# Altium footprint library con-molex.PCBLIB: 368 footprints (part 23 of 26)
Each footprint in its own frame and in the unit in brackets; x right, y up, seen from the top. Pads: shape width x height; smd on the part's side, far side on the other; paste and mask are expansions set on the pad; w line width, h text height; cw(c..) or ccw(c..) is an arc to the next point about the centre after c.
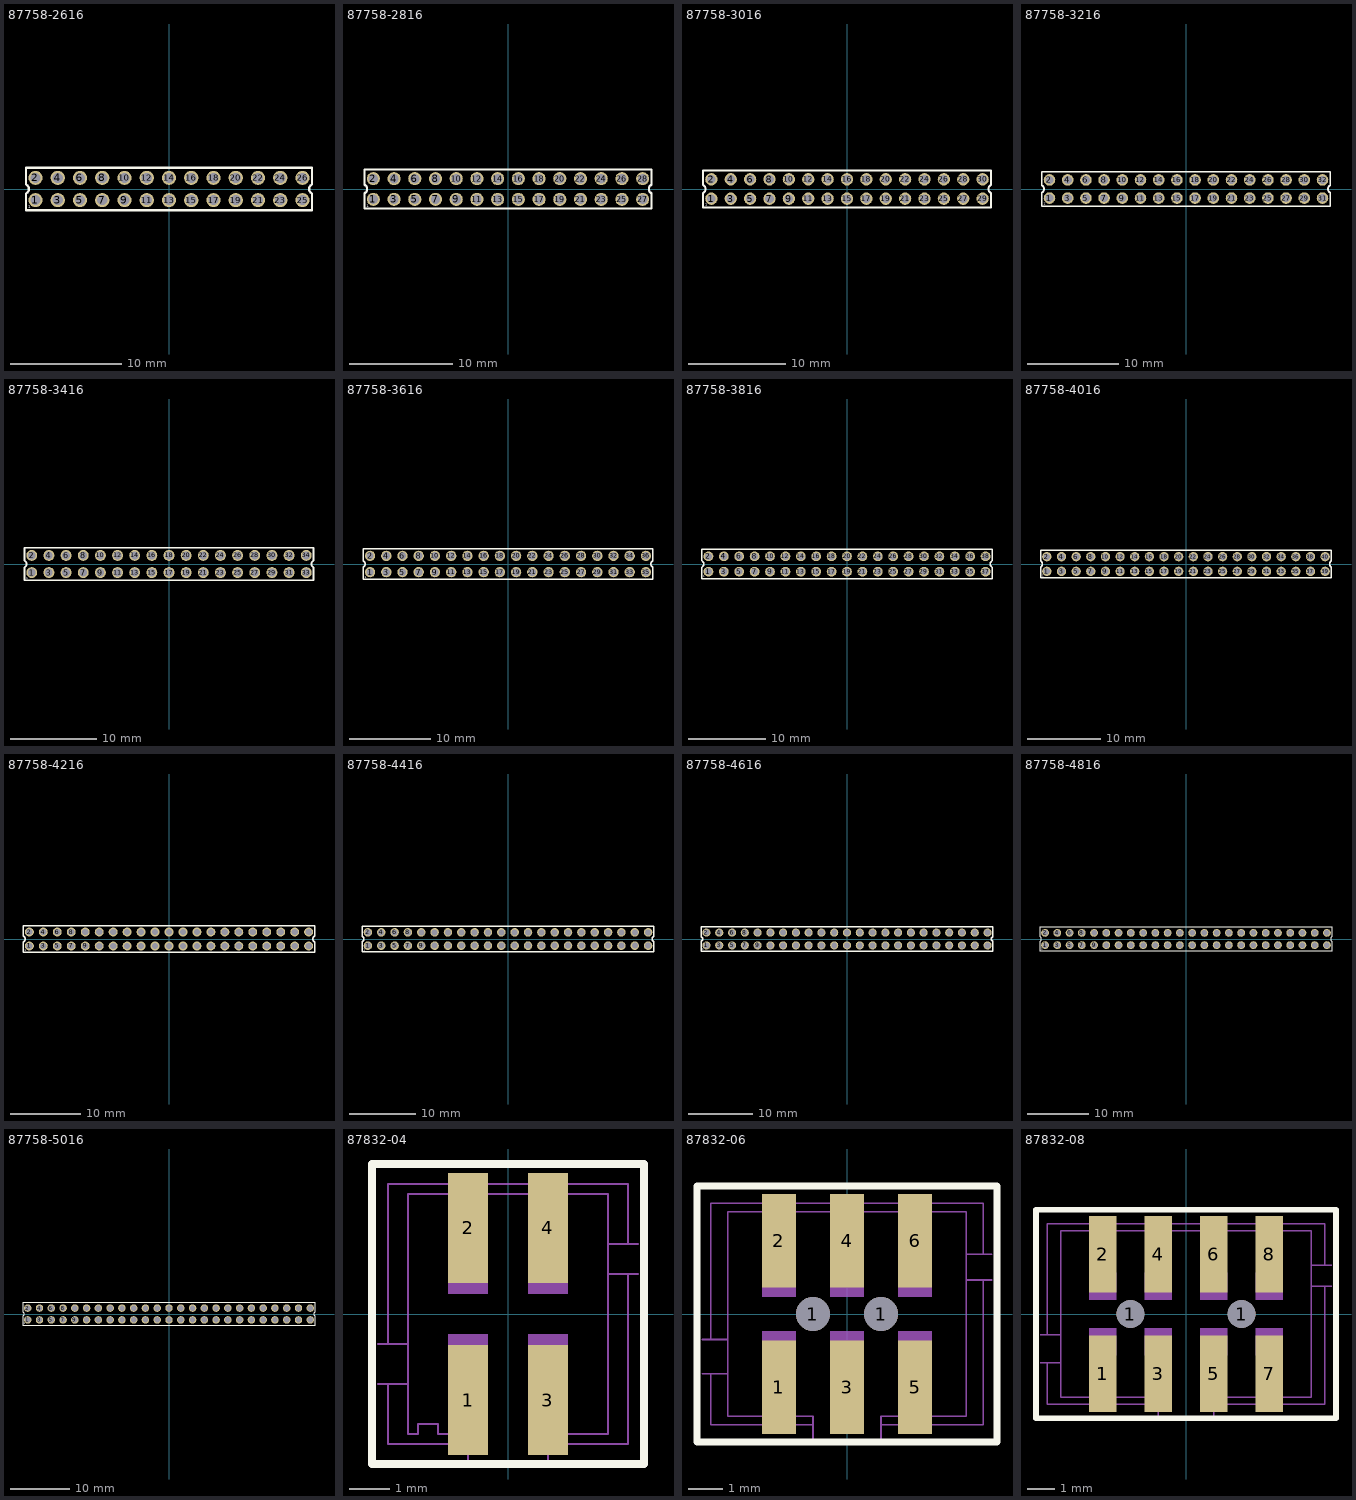
[diagram p22: the footprints below, top view; thin cyan lines are the x and y axes]

## 87758-2616 [mm]
pads (26):
  round 1.27 hole 0.9: 1(-12,-1) 2(-12,1) 3(-10,-1) 4(-10,1) 5(-8,-1) 6(-8,1) 7(-6,-1) 8(-6,1) 9(-4,-1) 10(-4,1) 11(-2,-1) 12(-2,1) 13(0,-1) 14(0,1) 15(2,-1) 16(2,1) 17(4,-1) 18(4,1) 19(6,-1) 20(6,1) 21(8,-1) 22(8,1) 23(10,-1) 24(10,1) 25(12,-1) 26(12,1)
Top Overlay:
  lines w0.203: -12.85,-1.9 12.85,-1.9 12.85,-0.4 cw(c13.04,0) 12.85,0.4 12.85,1.9 -12.85,1.9 -12.85,0.4 cw(c-13.04,0) -12.85,-0.4 -12.85,-1.9
  text "1" at -12.65,-1.75 h0.26
Mechanical 16:
  rectangle: -12.25,-1.25 -11.75,-0.75
  rectangle: -12.25,0.75 -11.75,1.25
  rectangle: -10.25,-1.25 -9.75,-0.75
  rectangle: -10.25,0.75 -9.75,1.25
  rectangle: -8.25,-1.25 -7.75,-0.75
  rectangle: -8.25,0.75 -7.75,1.25
  rectangle: -6.25,-1.25 -5.75,-0.75
  rectangle: -6.25,0.75 -5.75,1.25
  rectangle: -4.25,-1.25 -3.75,-0.75
  rectangle: -4.25,0.75 -3.75,1.25
  rectangle: -2.25,-1.25 -1.75,-0.75
  rectangle: -2.25,0.75 -1.75,1.25
  rectangle: -0.25,-1.25 0.25,-0.75
  rectangle: -0.25,0.75 0.25,1.25
  rectangle: 1.75,-1.25 2.25,-0.75
  rectangle: 1.75,0.75 2.25,1.25
  rectangle: 3.75,-1.25 4.25,-0.75
  rectangle: 3.75,0.75 4.25,1.25
  rectangle: 5.75,-1.25 6.25,-0.75
  rectangle: 5.75,0.75 6.25,1.25
  rectangle: 7.75,-1.25 8.25,-0.75
  rectangle: 7.75,0.75 8.25,1.25
  rectangle: 9.75,-1.25 10.25,-0.75
  rectangle: 9.75,0.75 10.25,1.25
  rectangle: 11.75,-1.25 12.25,-0.75
  rectangle: 11.75,0.75 12.25,1.25

## 87758-2816 [mm]
pads (28):
  round 1.27 hole 0.9: 1(-13,-1) 2(-13,1) 3(-11,-1) 4(-11,1) 5(-9,-1) 6(-9,1) 7(-7,-1) 8(-7,1) 9(-5,-1) 10(-5,1) 11(-3,-1) 12(-3,1) 13(-1,-1) 14(-1,1) 15(1,-1) 16(1,1) 17(3,-1) 18(3,1) 19(5,-1) 20(5,1) 21(7,-1) 22(7,1) 23(9,-1) 24(9,1) 25(11,-1) 26(11,1) 27(13,-1) 28(13,1)
Top Overlay:
  lines w0.203: -13.85,-1.9 13.85,-1.9 13.85,-0.4 cw(c14.04,0) 13.85,0.4 13.85,1.9 -13.85,1.9 -13.85,0.4 cw(c-14.04,0) -13.85,-0.4 -13.85,-1.9
  text "1" at -13.65,-1.75 h0.26
Mechanical 16:
  rectangle: -13.25,-1.25 -12.75,-0.75
  rectangle: -13.25,0.75 -12.75,1.25
  rectangle: -11.25,-1.25 -10.75,-0.75
  rectangle: -11.25,0.75 -10.75,1.25
  rectangle: -9.25,-1.25 -8.75,-0.75
  rectangle: -9.25,0.75 -8.75,1.25
  rectangle: -7.25,-1.25 -6.75,-0.75
  rectangle: -7.25,0.75 -6.75,1.25
  rectangle: -5.25,-1.25 -4.75,-0.75
  rectangle: -5.25,0.75 -4.75,1.25
  rectangle: -3.25,-1.25 -2.75,-0.75
  rectangle: -3.25,0.75 -2.75,1.25
  rectangle: -1.25,-1.25 -0.75,-0.75
  rectangle: -1.25,0.75 -0.75,1.25
  rectangle: 0.75,-1.25 1.25,-0.75
  rectangle: 0.75,0.75 1.25,1.25
  rectangle: 2.75,-1.25 3.25,-0.75
  rectangle: 2.75,0.75 3.25,1.25
  rectangle: 4.75,-1.25 5.25,-0.75
  rectangle: 4.75,0.75 5.25,1.25
  rectangle: 6.75,-1.25 7.25,-0.75
  rectangle: 6.75,0.75 7.25,1.25
  rectangle: 8.75,-1.25 9.25,-0.75
  rectangle: 8.75,0.75 9.25,1.25
  rectangle: 10.75,-1.25 11.25,-0.75
  rectangle: 10.75,0.75 11.25,1.25
  rectangle: 12.75,-1.25 13.25,-0.75
  rectangle: 12.75,0.75 13.25,1.25

## 87758-3016 [mm]
pads (30):
  round 1.27 hole 0.9: 1(-14,-1) 2(-14,1) 3(-12,-1) 4(-12,1) 5(-10,-1) 6(-10,1) 7(-8,-1) 8(-8,1) 9(-6,-1) 10(-6,1) 11(-4,-1) 12(-4,1) 13(-2,-1) 14(-2,1) 15(0,-1) 16(0,1) 17(2,-1) 18(2,1) 19(4,-1) 20(4,1) 21(6,-1) 22(6,1) 23(8,-1) 24(8,1) 25(10,-1) 26(10,1) 27(12,-1) 28(12,1) 29(14,-1) 30(14,1)
Top Overlay:
  lines w0.203: -14.85,-1.9 14.85,-1.9 14.85,-0.4 cw(c15.04,0) 14.85,0.4 14.85,1.9 -14.85,1.9 -14.85,0.4 cw(c-15.04,0) -14.85,-0.4 -14.85,-1.9
  text "1" at -14.65,-1.75 h0.26
Mechanical 16:
  rectangle: -14.25,-1.25 -13.75,-0.75
  rectangle: -14.25,0.75 -13.75,1.25
  rectangle: -12.25,-1.25 -11.75,-0.75
  rectangle: -12.25,0.75 -11.75,1.25
  rectangle: -10.25,-1.25 -9.75,-0.75
  rectangle: -10.25,0.75 -9.75,1.25
  rectangle: -8.25,-1.25 -7.75,-0.75
  rectangle: -8.25,0.75 -7.75,1.25
  rectangle: -6.25,-1.25 -5.75,-0.75
  rectangle: -6.25,0.75 -5.75,1.25
  rectangle: -4.25,-1.25 -3.75,-0.75
  rectangle: -4.25,0.75 -3.75,1.25
  rectangle: -2.25,-1.25 -1.75,-0.75
  rectangle: -2.25,0.75 -1.75,1.25
  rectangle: -0.25,-1.25 0.25,-0.75
  rectangle: -0.25,0.75 0.25,1.25
  rectangle: 1.75,-1.25 2.25,-0.75
  rectangle: 1.75,0.75 2.25,1.25
  rectangle: 3.75,-1.25 4.25,-0.75
  rectangle: 3.75,0.75 4.25,1.25
  rectangle: 5.75,-1.25 6.25,-0.75
  rectangle: 5.75,0.75 6.25,1.25
  rectangle: 7.75,-1.25 8.25,-0.75
  rectangle: 7.75,0.75 8.25,1.25
  rectangle: 9.75,-1.25 10.25,-0.75
  rectangle: 9.75,0.75 10.25,1.25
  rectangle: 11.75,-1.25 12.25,-0.75
  rectangle: 11.75,0.75 12.25,1.25
  rectangle: 13.75,-1.25 14.25,-0.75
  rectangle: 13.75,0.75 14.25,1.25

## 87758-3216 [mm]
pads (32):
  round 1.27 hole 0.9: 1(-15,-1) 2(-15,1) 3(-13,-1) 4(-13,1) 5(-11,-1) 6(-11,1) 7(-9,-1) 8(-9,1) 9(-7,-1) 10(-7,1) 11(-5,-1) 12(-5,1) 13(-3,-1) 14(-3,1) 15(-1,-1) 16(-1,1) 17(1,-1) 18(1,1) 19(3,-1) 20(3,1) 21(5,-1) 22(5,1) 23(7,-1) 24(7,1) 25(9,-1) 26(9,1) 27(11,-1) 28(11,1) 29(13,-1) 30(13,1) 31(15,-1) 32(15,1)
Top Overlay:
  lines w0.203: -15.85,-1.9 15.85,-1.9 15.85,-0.4 cw(c16.04,0) 15.85,0.4 15.85,1.9 -15.85,1.9 -15.85,0.4 cw(c-16.04,0) -15.85,-0.4 -15.85,-1.9
  text "1" at -15.65,-1.75 h0.26
Mechanical 16:
  rectangle: -15.25,-1.25 -14.75,-0.75
  rectangle: -15.25,0.75 -14.75,1.25
  rectangle: -13.25,-1.25 -12.75,-0.75
  rectangle: -13.25,0.75 -12.75,1.25
  rectangle: -11.25,-1.25 -10.75,-0.75
  rectangle: -11.25,0.75 -10.75,1.25
  rectangle: -9.25,-1.25 -8.75,-0.75
  rectangle: -9.25,0.75 -8.75,1.25
  rectangle: -7.25,-1.25 -6.75,-0.75
  rectangle: -7.25,0.75 -6.75,1.25
  rectangle: -5.25,-1.25 -4.75,-0.75
  rectangle: -5.25,0.75 -4.75,1.25
  rectangle: -3.25,-1.25 -2.75,-0.75
  rectangle: -3.25,0.75 -2.75,1.25
  rectangle: -1.25,-1.25 -0.75,-0.75
  rectangle: -1.25,0.75 -0.75,1.25
  rectangle: 0.75,-1.25 1.25,-0.75
  rectangle: 0.75,0.75 1.25,1.25
  rectangle: 2.75,-1.25 3.25,-0.75
  rectangle: 2.75,0.75 3.25,1.25
  rectangle: 4.75,-1.25 5.25,-0.75
  rectangle: 4.75,0.75 5.25,1.25
  rectangle: 6.75,-1.25 7.25,-0.75
  rectangle: 6.75,0.75 7.25,1.25
  rectangle: 8.75,-1.25 9.25,-0.75
  rectangle: 8.75,0.75 9.25,1.25
  rectangle: 10.75,-1.25 11.25,-0.75
  rectangle: 10.75,0.75 11.25,1.25
  rectangle: 12.75,-1.25 13.25,-0.75
  rectangle: 12.75,0.75 13.25,1.25
  rectangle: 14.75,-1.25 15.25,-0.75
  rectangle: 14.75,0.75 15.25,1.25

## 87758-3416 [mm]
pads (34):
  round 1.27 hole 0.9: 1(-16,-1) 2(-16,1) 3(-14,-1) 4(-14,1) 5(-12,-1) 6(-12,1) 7(-10,-1) 8(-10,1) 9(-8,-1) 10(-8,1) 11(-6,-1) 12(-6,1) 13(-4,-1) 14(-4,1) 15(-2,-1) 16(-2,1) 17(0,-1) 18(0,1) 19(2,-1) 20(2,1) 21(4,-1) 22(4,1) 23(6,-1) 24(6,1) 25(8,-1) 26(8,1) 27(10,-1) 28(10,1) 29(12,-1) 30(12,1) 31(14,-1) 32(14,1) 33(16,-1) 34(16,1)
Top Overlay:
  lines w0.203: -16.85,-1.9 16.85,-1.9 16.85,-0.4 cw(c17.04,0) 16.85,0.4 16.85,1.9 -16.85,1.9 -16.85,0.4 cw(c-17.04,0) -16.85,-0.4 -16.85,-1.9
  text "1" at -16.65,-1.75 h0.26
Mechanical 16:
  rectangle: -16.25,-1.25 -15.75,-0.75
  rectangle: -16.25,0.75 -15.75,1.25
  rectangle: -14.25,-1.25 -13.75,-0.75
  rectangle: -14.25,0.75 -13.75,1.25
  rectangle: -12.25,-1.25 -11.75,-0.75
  rectangle: -12.25,0.75 -11.75,1.25
  rectangle: -10.25,-1.25 -9.75,-0.75
  rectangle: -10.25,0.75 -9.75,1.25
  rectangle: -8.25,-1.25 -7.75,-0.75
  rectangle: -8.25,0.75 -7.75,1.25
  rectangle: -6.25,-1.25 -5.75,-0.75
  rectangle: -6.25,0.75 -5.75,1.25
  rectangle: -4.25,-1.25 -3.75,-0.75
  rectangle: -4.25,0.75 -3.75,1.25
  rectangle: -2.25,-1.25 -1.75,-0.75
  rectangle: -2.25,0.75 -1.75,1.25
  rectangle: -0.25,-1.25 0.25,-0.75
  rectangle: -0.25,0.75 0.25,1.25
  rectangle: 1.75,-1.25 2.25,-0.75
  rectangle: 1.75,0.75 2.25,1.25
  rectangle: 3.75,-1.25 4.25,-0.75
  rectangle: 3.75,0.75 4.25,1.25
  rectangle: 5.75,-1.25 6.25,-0.75
  rectangle: 5.75,0.75 6.25,1.25
  rectangle: 7.75,-1.25 8.25,-0.75
  rectangle: 7.75,0.75 8.25,1.25
  rectangle: 9.75,-1.25 10.25,-0.75
  rectangle: 9.75,0.75 10.25,1.25
  rectangle: 11.75,-1.25 12.25,-0.75
  rectangle: 11.75,0.75 12.25,1.25
  rectangle: 13.75,-1.25 14.25,-0.75
  rectangle: 13.75,0.75 14.25,1.25
  rectangle: 15.75,-1.25 16.25,-0.75
  rectangle: 15.75,0.75 16.25,1.25

## 87758-3616 [mm]
pads (36):
  round 1.27 hole 0.9: 1(-17,-1) 2(-17,1) 3(-15,-1) 4(-15,1) 5(-13,-1) 6(-13,1) 7(-11,-1) 8(-11,1) 9(-9,-1) 10(-9,1) 11(-7,-1) 12(-7,1) 13(-5,-1) 14(-5,1) 15(-3,-1) 16(-3,1) 17(-1,-1) 18(-1,1) 19(1,-1) 20(1,1) 21(3,-1) 22(3,1) 23(5,-1) 24(5,1) 25(7,-1) 26(7,1) 27(9,-1) 28(9,1) 29(11,-1) 30(11,1) 31(13,-1) 32(13,1) 33(15,-1) 34(15,1) 35(17,-1) 36(17,1)
Top Overlay:
  lines w0.203: -17.85,-1.9 17.85,-1.9 17.85,-0.4 cw(c18.04,0) 17.85,0.4 17.85,1.9 -17.85,1.9 -17.85,0.4 cw(c-18.04,0) -17.85,-0.4 -17.85,-1.9
  text "1" at -17.65,-1.75 h0.26
Mechanical 16:
  rectangle: -17.25,-1.25 -16.75,-0.75
  rectangle: -17.25,0.75 -16.75,1.25
  rectangle: -15.25,-1.25 -14.75,-0.75
  rectangle: -15.25,0.75 -14.75,1.25
  rectangle: -13.25,-1.25 -12.75,-0.75
  rectangle: -13.25,0.75 -12.75,1.25
  rectangle: -11.25,-1.25 -10.75,-0.75
  rectangle: -11.25,0.75 -10.75,1.25
  rectangle: -9.25,-1.25 -8.75,-0.75
  rectangle: -9.25,0.75 -8.75,1.25
  rectangle: -7.25,-1.25 -6.75,-0.75
  rectangle: -7.25,0.75 -6.75,1.25
  rectangle: -5.25,-1.25 -4.75,-0.75
  rectangle: -5.25,0.75 -4.75,1.25
  rectangle: -3.25,-1.25 -2.75,-0.75
  rectangle: -3.25,0.75 -2.75,1.25
  rectangle: -1.25,-1.25 -0.75,-0.75
  rectangle: -1.25,0.75 -0.75,1.25
  rectangle: 0.75,-1.25 1.25,-0.75
  rectangle: 0.75,0.75 1.25,1.25
  rectangle: 2.75,-1.25 3.25,-0.75
  rectangle: 2.75,0.75 3.25,1.25
  rectangle: 4.75,-1.25 5.25,-0.75
  rectangle: 4.75,0.75 5.25,1.25
  rectangle: 6.75,-1.25 7.25,-0.75
  rectangle: 6.75,0.75 7.25,1.25
  rectangle: 8.75,-1.25 9.25,-0.75
  rectangle: 8.75,0.75 9.25,1.25
  rectangle: 10.75,-1.25 11.25,-0.75
  rectangle: 10.75,0.75 11.25,1.25
  rectangle: 12.75,-1.25 13.25,-0.75
  rectangle: 12.75,0.75 13.25,1.25
  rectangle: 14.75,-1.25 15.25,-0.75
  rectangle: 14.75,0.75 15.25,1.25
  rectangle: 16.75,-1.25 17.25,-0.75
  rectangle: 16.75,0.75 17.25,1.25

## 87758-3816 [mm]
pads (38):
  round 1.27 hole 0.9: 1(-18,-1) 2(-18,1) 3(-16,-1) 4(-16,1) 5(-14,-1) 6(-14,1) 7(-12,-1) 8(-12,1) 9(-10,-1) 10(-10,1) 11(-8,-1) 12(-8,1) 13(-6,-1) 14(-6,1) 15(-4,-1) 16(-4,1) 17(-2,-1) 18(-2,1) 19(0,-1) 20(0,1) 21(2,-1) 22(2,1) 23(4,-1) 24(4,1) 25(6,-1) 26(6,1) 27(8,-1) 28(8,1) 29(10,-1) 30(10,1) 31(12,-1) 32(12,1) 33(14,-1) 34(14,1) 35(16,-1) 36(16,1) 37(18,-1) 38(18,1)
Top Overlay:
  lines w0.203: -18.85,-1.9 18.85,-1.9 18.85,-0.4 cw(c19.04,0) 18.85,0.4 18.85,1.9 -18.85,1.9 -18.85,0.4 cw(c-19.04,0) -18.85,-0.4 -18.85,-1.9
  text "1" at -18.65,-1.75 h0.26
Mechanical 16:
  rectangle: -18.25,-1.25 -17.75,-0.75
  rectangle: -18.25,0.75 -17.75,1.25
  rectangle: -16.25,-1.25 -15.75,-0.75
  rectangle: -16.25,0.75 -15.75,1.25
  rectangle: -14.25,-1.25 -13.75,-0.75
  rectangle: -14.25,0.75 -13.75,1.25
  rectangle: -12.25,-1.25 -11.75,-0.75
  rectangle: -12.25,0.75 -11.75,1.25
  rectangle: -10.25,-1.25 -9.75,-0.75
  rectangle: -10.25,0.75 -9.75,1.25
  rectangle: -8.25,-1.25 -7.75,-0.75
  rectangle: -8.25,0.75 -7.75,1.25
  rectangle: -6.25,-1.25 -5.75,-0.75
  rectangle: -6.25,0.75 -5.75,1.25
  rectangle: -4.25,-1.25 -3.75,-0.75
  rectangle: -4.25,0.75 -3.75,1.25
  rectangle: -2.25,-1.25 -1.75,-0.75
  rectangle: -2.25,0.75 -1.75,1.25
  rectangle: -0.25,-1.25 0.25,-0.75
  rectangle: -0.25,0.75 0.25,1.25
  rectangle: 1.75,-1.25 2.25,-0.75
  rectangle: 1.75,0.75 2.25,1.25
  rectangle: 3.75,-1.25 4.25,-0.75
  rectangle: 3.75,0.75 4.25,1.25
  rectangle: 5.75,-1.25 6.25,-0.75
  rectangle: 5.75,0.75 6.25,1.25
  rectangle: 7.75,-1.25 8.25,-0.75
  rectangle: 7.75,0.75 8.25,1.25
  rectangle: 9.75,-1.25 10.25,-0.75
  rectangle: 9.75,0.75 10.25,1.25
  rectangle: 11.75,-1.25 12.25,-0.75
  rectangle: 11.75,0.75 12.25,1.25
  rectangle: 13.75,-1.25 14.25,-0.75
  rectangle: 13.75,0.75 14.25,1.25
  rectangle: 15.75,-1.25 16.25,-0.75
  rectangle: 15.75,0.75 16.25,1.25
  rectangle: 17.75,-1.25 18.25,-0.75
  rectangle: 17.75,0.75 18.25,1.25

## 87758-4016 [mm]
pads (40):
  round 1.27 hole 0.9: 1(-19,-1) 2(-19,1) 3(-17,-1) 4(-17,1) 5(-15,-1) 6(-15,1) 7(-13,-1) 8(-13,1) 9(-11,-1) 10(-11,1) 11(-9,-1) 12(-9,1) 13(-7,-1) 14(-7,1) 15(-5,-1) 16(-5,1) 17(-3,-1) 18(-3,1) 19(-1,-1) 20(-1,1) 21(1,-1) 22(1,1) 23(3,-1) 24(3,1) 25(5,-1) 26(5,1) 27(7,-1) 28(7,1) 29(9,-1) 30(9,1) 31(11,-1) 32(11,1) 33(13,-1) 34(13,1) 35(15,-1) 36(15,1) 37(17,-1) 38(17,1) 39(19,-1) 40(19,1)
Top Overlay:
  lines w0.203: -19.85,-1.9 19.85,-1.9 19.85,-0.4 cw(c20.04,0) 19.85,0.4 19.85,1.9 -19.85,1.9 -19.85,0.4 cw(c-20.04,0) -19.85,-0.4 -19.85,-1.9
  text "1" at -19.65,-1.75 h0.26
Mechanical 16:
  rectangle: -19.25,-1.25 -18.75,-0.75
  rectangle: -19.25,0.75 -18.75,1.25
  rectangle: -17.25,-1.25 -16.75,-0.75
  rectangle: -17.25,0.75 -16.75,1.25
  rectangle: -15.25,-1.25 -14.75,-0.75
  rectangle: -15.25,0.75 -14.75,1.25
  rectangle: -13.25,-1.25 -12.75,-0.75
  rectangle: -13.25,0.75 -12.75,1.25
  rectangle: -11.25,-1.25 -10.75,-0.75
  rectangle: -11.25,0.75 -10.75,1.25
  rectangle: -9.25,-1.25 -8.75,-0.75
  rectangle: -9.25,0.75 -8.75,1.25
  rectangle: -7.25,-1.25 -6.75,-0.75
  rectangle: -7.25,0.75 -6.75,1.25
  rectangle: -5.25,-1.25 -4.75,-0.75
  rectangle: -5.25,0.75 -4.75,1.25
  rectangle: -3.25,-1.25 -2.75,-0.75
  rectangle: -3.25,0.75 -2.75,1.25
  rectangle: -1.25,-1.25 -0.75,-0.75
  rectangle: -1.25,0.75 -0.75,1.25
  rectangle: 0.75,-1.25 1.25,-0.75
  rectangle: 0.75,0.75 1.25,1.25
  rectangle: 2.75,-1.25 3.25,-0.75
  rectangle: 2.75,0.75 3.25,1.25
  rectangle: 4.75,-1.25 5.25,-0.75
  rectangle: 4.75,0.75 5.25,1.25
  rectangle: 6.75,-1.25 7.25,-0.75
  rectangle: 6.75,0.75 7.25,1.25
  rectangle: 8.75,-1.25 9.25,-0.75
  rectangle: 8.75,0.75 9.25,1.25
  rectangle: 10.75,-1.25 11.25,-0.75
  rectangle: 10.75,0.75 11.25,1.25
  rectangle: 12.75,-1.25 13.25,-0.75
  rectangle: 12.75,0.75 13.25,1.25
  rectangle: 14.75,-1.25 15.25,-0.75
  rectangle: 14.75,0.75 15.25,1.25
  rectangle: 16.75,-1.25 17.25,-0.75
  rectangle: 16.75,0.75 17.25,1.25
  rectangle: 18.75,-1.25 19.25,-0.75
  rectangle: 18.75,0.75 19.25,1.25

## 87758-4216 [mm]
pads (42):
  round 1.27 hole 0.9: 1(-20,-1) 2(-20,1) 3(-18,-1) 4(-18,1) 5(-16,-1) 6(-16,1) 7(-14,-1) 8(-14,1) 9(-12,-1) 10(-12,1) 11(-10,-1) 12(-10,1) 13(-8,-1) 14(-8,1) 15(-6,-1) 16(-6,1) 17(-4,-1) 18(-4,1) 19(-2,-1) 20(-2,1) 21(0,-1) 22(0,1) 23(2,-1) 24(2,1) 25(4,-1) 26(4,1) 27(6,-1) 28(6,1) 29(8,-1) 30(8,1) 31(10,-1) 32(10,1) 33(12,-1) 34(12,1) 35(14,-1) 36(14,1) 37(16,-1) 38(16,1) 39(18,-1) 40(18,1) 41(20,-1) 42(20,1)
Top Overlay:
  lines w0.203: -20.85,-1.9 20.85,-1.9 20.85,-0.4 cw(c21.04,0) 20.85,0.4 20.85,1.9 -20.85,1.9 -20.85,0.4 cw(c-21.04,0) -20.85,-0.4 -20.85,-1.9
  text "1" at -20.65,-1.75 h0.26
Mechanical 16:
  rectangle: -20.25,-1.25 -19.75,-0.75
  rectangle: -20.25,0.75 -19.75,1.25
  rectangle: -18.25,-1.25 -17.75,-0.75
  rectangle: -18.25,0.75 -17.75,1.25
  rectangle: -16.25,-1.25 -15.75,-0.75
  rectangle: -16.25,0.75 -15.75,1.25
  rectangle: -14.25,-1.25 -13.75,-0.75
  rectangle: -14.25,0.75 -13.75,1.25
  rectangle: -12.25,-1.25 -11.75,-0.75
  rectangle: -12.25,0.75 -11.75,1.25
  rectangle: -10.25,-1.25 -9.75,-0.75
  rectangle: -10.25,0.75 -9.75,1.25
  rectangle: -8.25,-1.25 -7.75,-0.75
  rectangle: -8.25,0.75 -7.75,1.25
  rectangle: -6.25,-1.25 -5.75,-0.75
  rectangle: -6.25,0.75 -5.75,1.25
  rectangle: -4.25,-1.25 -3.75,-0.75
  rectangle: -4.25,0.75 -3.75,1.25
  rectangle: -2.25,-1.25 -1.75,-0.75
  rectangle: -2.25,0.75 -1.75,1.25
  rectangle: -0.25,-1.25 0.25,-0.75
  rectangle: -0.25,0.75 0.25,1.25
  rectangle: 1.75,-1.25 2.25,-0.75
  rectangle: 1.75,0.75 2.25,1.25
  rectangle: 3.75,-1.25 4.25,-0.75
  rectangle: 3.75,0.75 4.25,1.25
  rectangle: 5.75,-1.25 6.25,-0.75
  rectangle: 5.75,0.75 6.25,1.25
  rectangle: 7.75,-1.25 8.25,-0.75
  rectangle: 7.75,0.75 8.25,1.25
  rectangle: 9.75,-1.25 10.25,-0.75
  rectangle: 9.75,0.75 10.25,1.25
  rectangle: 11.75,-1.25 12.25,-0.75
  rectangle: 11.75,0.75 12.25,1.25
  rectangle: 13.75,-1.25 14.25,-0.75
  rectangle: 13.75,0.75 14.25,1.25
  rectangle: 15.75,-1.25 16.25,-0.75
  rectangle: 15.75,0.75 16.25,1.25
  rectangle: 17.75,-1.25 18.25,-0.75
  rectangle: 17.75,0.75 18.25,1.25
  rectangle: 19.75,-1.25 20.25,-0.75
  rectangle: 19.75,0.75 20.25,1.25

## 87758-4416 [mm]
pads (44):
  round 1.27 hole 0.9: 1(-21,-1) 2(-21,1) 3(-19,-1) 4(-19,1) 5(-17,-1) 6(-17,1) 7(-15,-1) 8(-15,1) 9(-13,-1) 10(-13,1) 11(-11,-1) 12(-11,1) 13(-9,-1) 14(-9,1) 15(-7,-1) 16(-7,1) 17(-5,-1) 18(-5,1) 19(-3,-1) 20(-3,1) 21(-1,-1) 22(-1,1) 23(1,-1) 24(1,1) 25(3,-1) 26(3,1) 27(5,-1) 28(5,1) 29(7,-1) 30(7,1) 31(9,-1) 32(9,1) 33(11,-1) 34(11,1) 35(13,-1) 36(13,1) 37(15,-1) 38(15,1) 39(17,-1) 40(17,1) 41(19,-1) 42(19,1) 43(21,-1) 44(21,1)
Top Overlay:
  lines w0.203: -21.85,-1.9 21.85,-1.9 21.85,-0.4 cw(c22.04,0) 21.85,0.4 21.85,1.9 -21.85,1.9 -21.85,0.4 cw(c-22.04,0) -21.85,-0.4 -21.85,-1.9
  text "1" at -21.65,-1.75 h0.26
Mechanical 16:
  rectangle: -21.25,-1.25 -20.75,-0.75
  rectangle: -21.25,0.75 -20.75,1.25
  rectangle: -19.25,-1.25 -18.75,-0.75
  rectangle: -19.25,0.75 -18.75,1.25
  rectangle: -17.25,-1.25 -16.75,-0.75
  rectangle: -17.25,0.75 -16.75,1.25
  rectangle: -15.25,-1.25 -14.75,-0.75
  rectangle: -15.25,0.75 -14.75,1.25
  rectangle: -13.25,-1.25 -12.75,-0.75
  rectangle: -13.25,0.75 -12.75,1.25
  rectangle: -11.25,-1.25 -10.75,-0.75
  rectangle: -11.25,0.75 -10.75,1.25
  rectangle: -9.25,-1.25 -8.75,-0.75
  rectangle: -9.25,0.75 -8.75,1.25
  rectangle: -7.25,-1.25 -6.75,-0.75
  rectangle: -7.25,0.75 -6.75,1.25
  rectangle: -5.25,-1.25 -4.75,-0.75
  rectangle: -5.25,0.75 -4.75,1.25
  rectangle: -3.25,-1.25 -2.75,-0.75
  rectangle: -3.25,0.75 -2.75,1.25
  rectangle: -1.25,-1.25 -0.75,-0.75
  rectangle: -1.25,0.75 -0.75,1.25
  rectangle: 0.75,-1.25 1.25,-0.75
  rectangle: 0.75,0.75 1.25,1.25
  rectangle: 2.75,-1.25 3.25,-0.75
  rectangle: 2.75,0.75 3.25,1.25
  rectangle: 4.75,-1.25 5.25,-0.75
  rectangle: 4.75,0.75 5.25,1.25
  rectangle: 6.75,-1.25 7.25,-0.75
  rectangle: 6.75,0.75 7.25,1.25
  rectangle: 8.75,-1.25 9.25,-0.75
  rectangle: 8.75,0.75 9.25,1.25
  rectangle: 10.75,-1.25 11.25,-0.75
  rectangle: 10.75,0.75 11.25,1.25
  rectangle: 12.75,-1.25 13.25,-0.75
  rectangle: 12.75,0.75 13.25,1.25
  rectangle: 14.75,-1.25 15.25,-0.75
  rectangle: 14.75,0.75 15.25,1.25
  rectangle: 16.75,-1.25 17.25,-0.75
  rectangle: 16.75,0.75 17.25,1.25
  rectangle: 18.75,-1.25 19.25,-0.75
  rectangle: 18.75,0.75 19.25,1.25
  rectangle: 20.75,-1.25 21.25,-0.75
  rectangle: 20.75,0.75 21.25,1.25

## 87758-4616 [mm]
pads (46):
  round 1.27 hole 0.9: 1(-22,-1) 2(-22,1) 3(-20,-1) 4(-20,1) 5(-18,-1) 6(-18,1) 7(-16,-1) 8(-16,1) 9(-14,-1) 10(-14,1) 11(-12,-1) 12(-12,1) 13(-10,-1) 14(-10,1) 15(-8,-1) 16(-8,1) 17(-6,-1) 18(-6,1) 19(-4,-1) 20(-4,1) 21(-2,-1) 22(-2,1) 23(0,-1) 24(0,1) 25(2,-1) 26(2,1) 27(4,-1) 28(4,1) 29(6,-1) 30(6,1) 31(8,-1) 32(8,1) 33(10,-1) 34(10,1) 35(12,-1) 36(12,1) 37(14,-1) 38(14,1) 39(16,-1) 40(16,1) 41(18,-1) 42(18,1) 43(20,-1) 44(20,1) 45(22,-1) 46(22,1)
Top Overlay:
  lines w0.203: -22.85,-1.9 22.85,-1.9 22.85,-0.4 cw(c23.04,0) 22.85,0.4 22.85,1.9 -22.85,1.9 -22.85,0.4 cw(c-23.04,0) -22.85,-0.4 -22.85,-1.9
  text "1" at -22.65,-1.75 h0.26
Mechanical 16:
  rectangle: -22.25,-1.25 -21.75,-0.75
  rectangle: -22.25,0.75 -21.75,1.25
  rectangle: -20.25,-1.25 -19.75,-0.75
  rectangle: -20.25,0.75 -19.75,1.25
  rectangle: -18.25,-1.25 -17.75,-0.75
  rectangle: -18.25,0.75 -17.75,1.25
  rectangle: -16.25,-1.25 -15.75,-0.75
  rectangle: -16.25,0.75 -15.75,1.25
  rectangle: -14.25,-1.25 -13.75,-0.75
  rectangle: -14.25,0.75 -13.75,1.25
  rectangle: -12.25,-1.25 -11.75,-0.75
  rectangle: -12.25,0.75 -11.75,1.25
  rectangle: -10.25,-1.25 -9.75,-0.75
  rectangle: -10.25,0.75 -9.75,1.25
  rectangle: -8.25,-1.25 -7.75,-0.75
  rectangle: -8.25,0.75 -7.75,1.25
  rectangle: -6.25,-1.25 -5.75,-0.75
  rectangle: -6.25,0.75 -5.75,1.25
  rectangle: -4.25,-1.25 -3.75,-0.75
  rectangle: -4.25,0.75 -3.75,1.25
  rectangle: -2.25,-1.25 -1.75,-0.75
  rectangle: -2.25,0.75 -1.75,1.25
  rectangle: -0.25,-1.25 0.25,-0.75
  rectangle: -0.25,0.75 0.25,1.25
  rectangle: 1.75,-1.25 2.25,-0.75
  rectangle: 1.75,0.75 2.25,1.25
  rectangle: 3.75,-1.25 4.25,-0.75
  rectangle: 3.75,0.75 4.25,1.25
  rectangle: 5.75,-1.25 6.25,-0.75
  rectangle: 5.75,0.75 6.25,1.25
  rectangle: 7.75,-1.25 8.25,-0.75
  rectangle: 7.75,0.75 8.25,1.25
  rectangle: 9.75,-1.25 10.25,-0.75
  rectangle: 9.75,0.75 10.25,1.25
  rectangle: 11.75,-1.25 12.25,-0.75
  rectangle: 11.75,0.75 12.25,1.25
  rectangle: 13.75,-1.25 14.25,-0.75
  rectangle: 13.75,0.75 14.25,1.25
  rectangle: 15.75,-1.25 16.25,-0.75
  rectangle: 15.75,0.75 16.25,1.25
  rectangle: 17.75,-1.25 18.25,-0.75
  rectangle: 17.75,0.75 18.25,1.25
  rectangle: 19.75,-1.25 20.25,-0.75
  rectangle: 19.75,0.75 20.25,1.25
  rectangle: 21.75,-1.25 22.25,-0.75
  rectangle: 21.75,0.75 22.25,1.25

## 87758-4816 [mm]
pads (48):
  round 1.27 hole 0.9: 1(-23,-1) 2(-23,1) 3(-21,-1) 4(-21,1) 5(-19,-1) 6(-19,1) 7(-17,-1) 8(-17,1) 9(-15,-1) 10(-15,1) 11(-13,-1) 12(-13,1) 13(-11,-1) 14(-11,1) 15(-9,-1) 16(-9,1) 17(-7,-1) 18(-7,1) 19(-5,-1) 20(-5,1) 21(-3,-1) 22(-3,1) 23(-1,-1) 24(-1,1) 25(1,-1) 26(1,1) 27(3,-1) 28(3,1) 29(5,-1) 30(5,1) 31(7,-1) 32(7,1) 33(9,-1) 34(9,1) 35(11,-1) 36(11,1) 37(13,-1) 38(13,1) 39(15,-1) 40(15,1) 41(17,-1) 42(17,1) 43(19,-1) 44(19,1) 45(21,-1) 46(21,1) 47(23,-1) 48(23,1)
Top Overlay:
  lines w0.203: -23.85,-1.9 23.85,-1.9 23.85,-0.4 cw(c24.04,0) 23.85,0.4 23.85,1.9 -23.85,1.9 -23.85,0.4 cw(c-24.04,0) -23.85,-0.4 -23.85,-1.9
  text "1" at -23.65,-1.75 h0.26
Mechanical 16:
  rectangle: -23.25,-1.25 -22.75,-0.75
  rectangle: -23.25,0.75 -22.75,1.25
  rectangle: -21.25,-1.25 -20.75,-0.75
  rectangle: -21.25,0.75 -20.75,1.25
  rectangle: -19.25,-1.25 -18.75,-0.75
  rectangle: -19.25,0.75 -18.75,1.25
  rectangle: -17.25,-1.25 -16.75,-0.75
  rectangle: -17.25,0.75 -16.75,1.25
  rectangle: -15.25,-1.25 -14.75,-0.75
  rectangle: -15.25,0.75 -14.75,1.25
  rectangle: -13.25,-1.25 -12.75,-0.75
  rectangle: -13.25,0.75 -12.75,1.25
  rectangle: -11.25,-1.25 -10.75,-0.75
  rectangle: -11.25,0.75 -10.75,1.25
  rectangle: -9.25,-1.25 -8.75,-0.75
  rectangle: -9.25,0.75 -8.75,1.25
  rectangle: -7.25,-1.25 -6.75,-0.75
  rectangle: -7.25,0.75 -6.75,1.25
  rectangle: -5.25,-1.25 -4.75,-0.75
  rectangle: -5.25,0.75 -4.75,1.25
  rectangle: -3.25,-1.25 -2.75,-0.75
  rectangle: -3.25,0.75 -2.75,1.25
  rectangle: -1.25,-1.25 -0.75,-0.75
  rectangle: -1.25,0.75 -0.75,1.25
  rectangle: 0.75,-1.25 1.25,-0.75
  rectangle: 0.75,0.75 1.25,1.25
  rectangle: 2.75,-1.25 3.25,-0.75
  rectangle: 2.75,0.75 3.25,1.25
  rectangle: 4.75,-1.25 5.25,-0.75
  rectangle: 4.75,0.75 5.25,1.25
  rectangle: 6.75,-1.25 7.25,-0.75
  rectangle: 6.75,0.75 7.25,1.25
  rectangle: 8.75,-1.25 9.25,-0.75
  rectangle: 8.75,0.75 9.25,1.25
  rectangle: 10.75,-1.25 11.25,-0.75
  rectangle: 10.75,0.75 11.25,1.25
  rectangle: 12.75,-1.25 13.25,-0.75
  rectangle: 12.75,0.75 13.25,1.25
  rectangle: 14.75,-1.25 15.25,-0.75
  rectangle: 14.75,0.75 15.25,1.25
  rectangle: 16.75,-1.25 17.25,-0.75
  rectangle: 16.75,0.75 17.25,1.25
  rectangle: 18.75,-1.25 19.25,-0.75
  rectangle: 18.75,0.75 19.25,1.25
  rectangle: 20.75,-1.25 21.25,-0.75
  rectangle: 20.75,0.75 21.25,1.25
  rectangle: 22.75,-1.25 23.25,-0.75
  rectangle: 22.75,0.75 23.25,1.25

## 87758-5016 [mm]
pads (50):
  round 1.27 hole 0.9: 1(-24,-1) 2(-24,1) 3(-22,-1) 4(-22,1) 5(-20,-1) 6(-20,1) 7(-18,-1) 8(-18,1) 9(-16,-1) 10(-16,1) 11(-14,-1) 12(-14,1) 13(-12,-1) 14(-12,1) 15(-10,-1) 16(-10,1) 17(-8,-1) 18(-8,1) 19(-6,-1) 20(-6,1) 21(-4,-1) 22(-4,1) 23(-2,-1) 24(-2,1) 25(0,-1) 26(0,1) 27(2,-1) 28(2,1) 29(4,-1) 30(4,1) 31(6,-1) 32(6,1) 33(8,-1) 34(8,1) 35(10,-1) 36(10,1) 37(12,-1) 38(12,1) 39(14,-1) 40(14,1) 41(16,-1) 42(16,1) 43(18,-1) 44(18,1) 45(20,-1) 46(20,1) 47(22,-1) 48(22,1) 49(24,-1) 50(24,1)
Top Overlay:
  lines w0.203: -24.85,-1.9 24.85,-1.9 24.85,-0.4 cw(c25.04,0) 24.85,0.4 24.85,1.9 -24.85,1.9 -24.85,0.4 cw(c-25.04,0) -24.85,-0.4 -24.85,-1.9
  text "1" at -24.65,-1.75 h0.26
Mechanical 16:
  rectangle: -24.25,-1.25 -23.75,-0.75
  rectangle: -24.25,0.75 -23.75,1.25
  rectangle: -22.25,-1.25 -21.75,-0.75
  rectangle: -22.25,0.75 -21.75,1.25
  rectangle: -20.25,-1.25 -19.75,-0.75
  rectangle: -20.25,0.75 -19.75,1.25
  rectangle: -18.25,-1.25 -17.75,-0.75
  rectangle: -18.25,0.75 -17.75,1.25
  rectangle: -16.25,-1.25 -15.75,-0.75
  rectangle: -16.25,0.75 -15.75,1.25
  rectangle: -14.25,-1.25 -13.75,-0.75
  rectangle: -14.25,0.75 -13.75,1.25
  rectangle: -12.25,-1.25 -11.75,-0.75
  rectangle: -12.25,0.75 -11.75,1.25
  rectangle: -10.25,-1.25 -9.75,-0.75
  rectangle: -10.25,0.75 -9.75,1.25
  rectangle: -8.25,-1.25 -7.75,-0.75
  rectangle: -8.25,0.75 -7.75,1.25
  rectangle: -6.25,-1.25 -5.75,-0.75
  rectangle: -6.25,0.75 -5.75,1.25
  rectangle: -4.25,-1.25 -3.75,-0.75
  rectangle: -4.25,0.75 -3.75,1.25
  rectangle: -2.25,-1.25 -1.75,-0.75
  rectangle: -2.25,0.75 -1.75,1.25
  rectangle: -0.25,-1.25 0.25,-0.75
  rectangle: -0.25,0.75 0.25,1.25
  rectangle: 1.75,-1.25 2.25,-0.75
  rectangle: 1.75,0.75 2.25,1.25
  rectangle: 3.75,-1.25 4.25,-0.75
  rectangle: 3.75,0.75 4.25,1.25
  rectangle: 5.75,-1.25 6.25,-0.75
  rectangle: 5.75,0.75 6.25,1.25
  rectangle: 7.75,-1.25 8.25,-0.75
  rectangle: 7.75,0.75 8.25,1.25
  rectangle: 9.75,-1.25 10.25,-0.75
  rectangle: 9.75,0.75 10.25,1.25
  rectangle: 11.75,-1.25 12.25,-0.75
  rectangle: 11.75,0.75 12.25,1.25
  rectangle: 13.75,-1.25 14.25,-0.75
  rectangle: 13.75,0.75 14.25,1.25
  rectangle: 15.75,-1.25 16.25,-0.75
  rectangle: 15.75,0.75 16.25,1.25
  rectangle: 17.75,-1.25 18.25,-0.75
  rectangle: 17.75,0.75 18.25,1.25
  rectangle: 19.75,-1.25 20.25,-0.75
  rectangle: 19.75,0.75 20.25,1.25
  rectangle: 21.75,-1.25 22.25,-0.75
  rectangle: 21.75,0.75 22.25,1.25
  rectangle: 23.75,-1.25 24.25,-0.75
  rectangle: 23.75,0.75 24.25,1.25

## 87832-04 [mm]
pads (4):
  rect 1x2.75 smd: 1(-1,-2.15) 2(-1,2.15) 3(1,-2.15) 4(1,2.15)
Top Overlay:
  lines w0.203: -3.4,-3.75 3.4,-3.75 3.4,3.75 -3.4,3.75 -3.4,-3.75
Mechanical 16:
  rectangle: -1.5,0.5 -0.5,1.5
  rectangle: 0.5,0.5 1.5,1.5
  rectangle: -1.5,-1.5 -0.5,-0.5
  rectangle: 0.5,-1.5 1.5,-0.5
  lines w0.051: -3.25,-1.75 -3,-1.75 ; -3.25,-0.75 -3,-0.75 ; -1,-3.75 -1,-3.25 ; 1,-3.75 1,-3.25 ; 3.25,1 3,1 ; 3.25,1.75 3,1.75 ; -3,-1.75 -2.5,-1.75 ; -3,-1.75 -3,-3.25 -1,-3.25 ; -3,-0.75 -2.5,-0.75 ; -3,-0.75 -3,3.25 3,3.25 3,1.75 ; -2.5,-1.75 -2.5,-0.75 ; -2.5,-1.75 -2.5,-3 -2.25,-3 -2.25,-2.75 -1.75,-2.75 -1.75,-3 -1,-3 -1,-3.25 ; -2.5,-0.75 -2.5,3 -1.25,3 -1.25,2.75 -0.75,2.75 -0.75,3 0.75,3 0.75,2.75 1.25,2.75 1.25,3 2.5,3 2.5,1.75 ; 1,-3.25 1,-3 2.5,-3 2.5,1 ; 1,-3.25 3,-3.25 3,1 ; 2.5,1 2.5,1.75 ; 2.5,1 3,1 ; 2.5,1.75 3,1.75
  text "1" at -2.25,-2.5 h0.94

## 87832-06 [mm]
pads (8):
  rect 1x2.75 smd: 1(-2,-2.15) 2(-2,2.15) 3(0,-2.15) 4(0,2.15) 5(2,-2.15) 6(2,2.15)
  round 1 hole 1: 1(-1,0) 1(1,0)
Top Overlay:
  lines w0.203: -4.4,-3.75 4.4,-3.75 4.4,3.75 -4.4,3.75 -4.4,-3.75
Mechanical 16:
  rectangle: -2.5,0.5 -1.5,1.5
  rectangle: -0.5,0.5 0.5,1.5
  rectangle: 1.5,0.5 2.5,1.5
  rectangle: -2.5,-1.5 -1.5,-0.5
  rectangle: -0.5,-1.5 0.5,-0.5
  rectangle: 1.5,-1.5 2.5,-0.5
  lines w0.051: -4.25,-1.75 -4,-1.75 ; -4.25,-0.75 -4,-0.75 ; -1,-3.75 -1,-3.25 ; 1,-3.75 1,-3.25 ; 4.25,1 4,1 ; 4.25,1.75 4,1.75 ; -4,-1.75 -3.5,-1.75 ; -4,-1.75 -4,-3.25 -1,-3.25 ; -4,-0.75 -3.5,-0.75 ; -4,-0.75 -4,3.25 4,3.25 4,1.75 ; -3.5,-1.75 -3.5,-0.75 ; -3.5,-1.75 -3.5,-3 -2.25,-3 -2.25,-2.75 -1.75,-2.75 -1.75,-3 -1,-3 -1,-3.25 ; -3.5,-0.75 -3.5,3 -2.25,3 -2.25,2.75 -1.75,2.75 -1.75,3 -0.25,3 -0.25,2.75 0.25,2.75 0.25,3 1.75,3 1.75,2.75 2.25,2.75 2.25,3 3.5,3 3.5,1.75 ; 1,-3.25 1,-3 1.75,-3 1.75,-2.75 2.25,-2.75 2.25,-3 3.5,-3 3.5,1 ; 1,-3.25 4,-3.25 4,1 ; 3.5,1 3.5,1.75 ; 3.5,1 4,1 ; 3.5,1.75 4,1.75
  text "1" at -3.25,-2.75 h0.94

## 87832-08 [mm]
pads (10):
  rect 1x2.75 smd: 1(-3,-2.15) 2(-3,2.15) 3(-1,-2.15) 4(-1,2.15) 5(1,-2.15) 6(1,2.15) 7(3,-2.15) 8(3,2.15)
  round 1 hole 1: 1(-2,0) 1(2,0)
Top Overlay:
  lines w0.203: -5.4,-3.75 5.4,-3.75 5.4,3.75 -5.4,3.75 -5.4,-3.75
Mechanical 16:
  rectangle: -3.5,0.5 -2.5,1.5
  rectangle: -1.5,0.5 -0.5,1.5
  rectangle: 0.5,0.5 1.5,1.5
  rectangle: 2.5,0.5 3.5,1.5
  rectangle: -3.5,-1.5 -2.5,-0.5
  rectangle: -1.5,-1.5 -0.5,-0.5
  rectangle: 0.5,-1.5 1.5,-0.5
  rectangle: 2.5,-1.5 3.5,-0.5
  lines w0.051: -5.25,-1.75 -5,-1.75 ; -5.25,-0.75 -5,-0.75 ; -1,-3.75 -1,-3.25 ; 1,-3.75 1,-3.25 ; 5.25,1 5,1 ; 5.25,1.75 5,1.75 ; -5,-1.75 -4.5,-1.75 ; -5,-1.75 -5,-3.25 -1,-3.25 ; -5,-0.75 -4.5,-0.75 ; -5,-0.75 -5,3.25 5,3.25 5,1.75 ; -4.5,-1.75 -4.5,-0.75 ; -4.5,-1.75 -4.5,-3 -3.25,-3 -3.25,-2.75 -2.75,-2.75 -2.75,-3 -1,-3 -1,-3.25 ; -4.5,-0.75 -4.5,3 -3.25,3 -3.25,2.75 -2.75,2.75 -2.75,3 -1.25,3 -1.25,2.75 -0.75,2.75 -0.75,3 0.75,3 0.75,2.75 1.25,2.75 1.25,3 2.75,3 2.75,2.75 3.25,2.75 3.25,3 4.5,3 4.5,1.75 ; 1,-3.25 1,-3 2.75,-3 2.75,-2.75 3.25,-2.75 3.25,-3 4.5,-3 4.5,1 ; 1,-3.25 5,-3.25 5,1 ; 4.5,1 4.5,1.75 ; 4.5,1 5,1 ; 4.5,1.75 5,1.75
  text "1" at -4.25,-2.75 h0.94